# Altium footprint library Pezo_imp.PCBLIB: 98 footprints (part 6 of 7)
Each footprint in its own frame and in the unit in brackets; x right, y up, seen from the top. Pads: shape width x height; smd on the part's side, far side on the other; paste and mask are expansions set on the pad; w line width, h text height; cw(c..) or ccw(c..) is an arc to the next point about the centre after c.
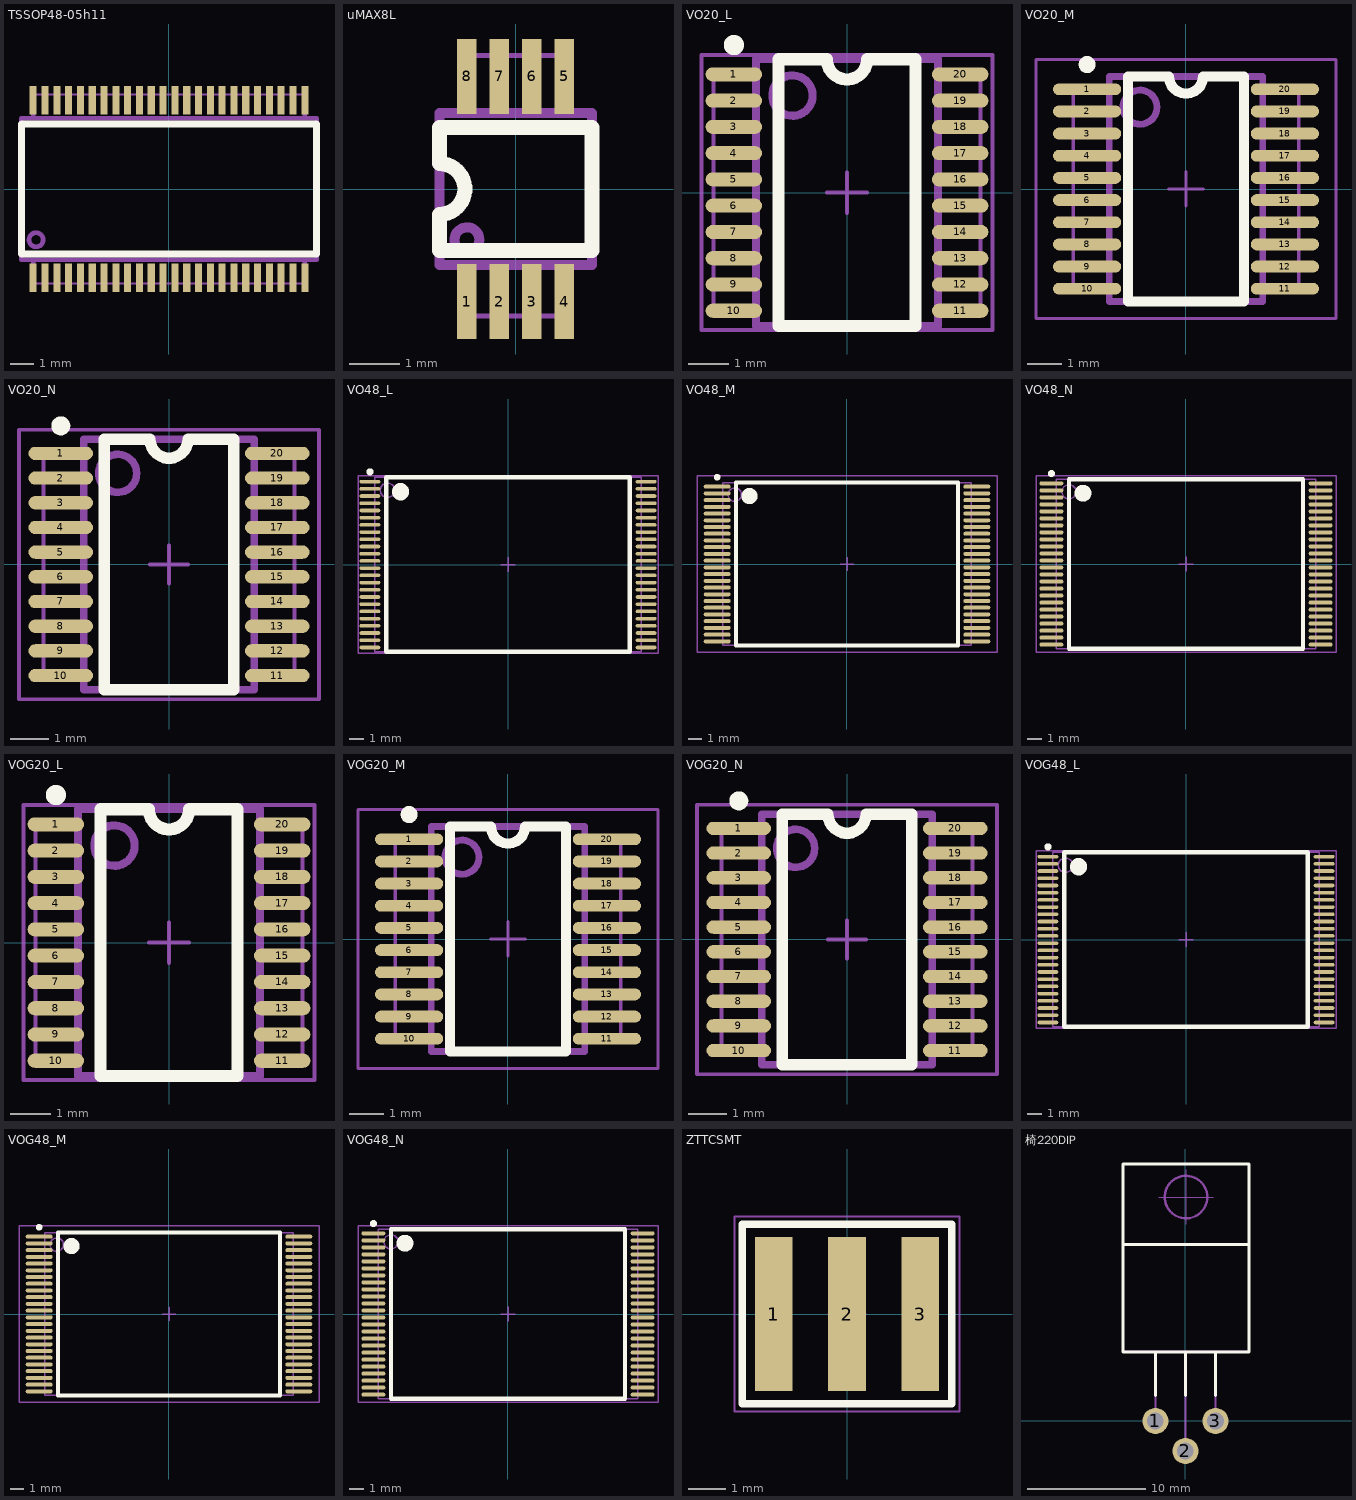
[diagram p5: the footprints below, top view; thin cyan lines are the x and y axes]

## TSSOP48-05h11 [mm]
height 1.1
pads (48):
  rect 0.3x1.2 smd: 1(-5.75,-3.75) 2(-5.25,-3.75) 3(-4.75,-3.75) 4(-4.25,-3.75) 5(-3.75,-3.75) 6(-3.25,-3.75) 7(-2.75,-3.75) 8(-2.25,-3.75) 9(-1.75,-3.75) 10(-1.25,-3.75) 11(-0.75,-3.75) 12(-0.25,-3.75) 13(0.25,-3.75) 14(0.75,-3.75) 15(1.25,-3.75) 16(1.75,-3.75) 17(2.25,-3.75) 18(2.75,-3.75) 19(3.25,-3.75) 20(3.75,-3.75) 21(4.25,-3.75) 22(4.75,-3.75) 23(5.25,-3.75) 24(5.75,-3.75) 25(5.75,3.75) 26(5.25,3.75) 27(4.75,3.75) 28(4.25,3.75) 29(3.75,3.75) 30(3.25,3.75) 31(2.75,3.75) 32(2.25,3.75) 33(1.75,3.75) 34(1.25,3.75) 35(0.75,3.75) 36(0.25,3.75) 37(-0.25,3.75) 38(-0.75,3.75) 39(-1.25,3.75) 40(-1.75,3.75) 41(-2.25,3.75) 42(-2.75,3.75) 43(-3.25,3.75) 44(-3.75,3.75) 45(-4.25,3.75) 46(-4.75,3.75) 47(-5.25,3.75) 48(-5.75,3.75)
Top Overlay:
  lines w0.3: -6.25,-2.75 6.25,-2.75 6.25,2.75 -6.25,2.75 -6.25,-2.75
Mechanical 1:
  circle w0.2: c-5.625,-2.15 r0.3
  lines w0.1: -5.75,-4 -0.4,-4 ; -5.75,4 -0.4,4 ; -0.05,-4 0.05,-4 ; -0.05,4 0.05,4 ; 0.4,-4 5.75,-4 ; 0.4,4 5.75,4
  lines w0.2: -5.75,-4 -5.75,-3 ; -5.75,3 -5.75,4 ; 5.75,-4 5.75,-3 ; 5.75,3 5.75,4 ; -6.25,-3 6.25,-3 6.25,3 -6.25,3 -6.25,-3
  text "48" at -5.623,1.457 h1.5
  text ".Designator" at -0.765,0.63 h1.5
  text ".Comment" at -2.355,-1.07 h1.5
3D body "TSSOP48-05h11.stp": height 1.21, standoff 0, extent -6.25,-4 6.25,4

## uMAX8L [mm]
height 1.1
pads (8):
  rect 0.39x1.5 smd: 1(-0.975,-2.25) 2(-0.325,-2.25) 3(0.325,-2.25) 4(0.975,-2.25) 5(0.975,2.25) 6(0.325,2.25) 7(-0.325,2.25) 8(-0.975,2.25)
Top Overlay:
  lines w0.3: -1.524,-1.23 -1.524,-0.508 ccw(c-1.524,0) -1.524,0.508 -1.524,1.23 1.524,1.23 1.524,-1.23 -1.524,-1.23
Mechanical 1:
  circle w0.2: c-0.975,-1.016 r0.25
  lines w0.1: -1.016,-2.54 -0.381,-2.54 ; -1.016,2.667 -0.381,2.667 ; -0.127,-2.54 0.127,-2.54 ; -0.127,2.667 0.127,2.667 ; 0.381,-2.54 1.016,-2.54 ; 0.381,2.667 1.016,2.667
  lines w0.2: -1.016,-2.54 -1.016,-1.524 ; -1.016,1.651 -1.016,2.667 ; 1.016,-2.54 1.016,-1.524 ; 1.016,1.651 1.016,2.667 ; -1.524,-1.524 1.524,-1.524 1.524,1.524 -1.524,1.524 -1.524,-1.524
  text ".Designator" at -1.3,0.3 h1.5
  text ".Comment" at -1.225,-1.1 h1.5

## VO20_L [mm] "TSOP, 20-Leads, Body 6.5x4.4mm, Pitch 0.65mm, IPC High Density"
height 1.2
pads (20):
  oval 1.4x0.35 smd: 1(-2.8,2.925) 2(-2.8,2.275) 3(-2.8,1.625) 4(-2.8,0.975) 5(-2.8,0.325) 6(-2.8,-0.325) 7(-2.8,-0.975) 8(-2.8,-1.625) 9(-2.8,-2.275) 10(-2.8,-2.925) 11(2.8,-2.925) 12(2.8,-2.275) 13(2.8,-1.625) 14(2.8,-0.975) 15(2.8,-0.325) 16(2.8,0.325) 17(2.8,0.975) 18(2.8,1.625) 19(2.8,2.275) 20(2.8,2.925)
Top Overlay:
  circle w0.25: c-2.8,3.65 r0.125
  lines w0.3: -1.7,-3.3 1.7,-3.3 1.7,3.3 0.5,3.3 cw(c0,3.3) -0.5,3.3 -1.7,3.3 -1.7,-3.3
Mechanical 1:
  circle w0.2: c-1.35,2.4 r0.5
  lines w0.1: -3.302,-2.921 -3.302,-0.5 ; -3.302,-0.127 -3.302,0.127 ; -3.302,0.5 -3.302,2.921 ; 3.302,-2.921 3.302,-0.5 ; 3.302,-0.127 3.302,0.127 ; 3.302,0.5 3.302,2.921
  lines w0.2: -3.302,-2.921 -2.25,-2.921 ; -3.302,2.921 -2.25,2.921 ; 2.25,-2.921 3.302,-2.921 ; 2.25,2.921 3.302,2.921 ; -2.25,-3.3 2.25,-3.3 2.25,3.3 -2.25,3.3 -2.25,-3.3
  text ".Comment" at -1.7,2.9 h1.5
  text ".Designator" at 0.85,1.61 h1.5
Mechanical 15:
  lines w0.1: -0.5,0 0.5,0 ; 0,-0.5 0,0.5 ; -3.6,-3.4 3.6,-3.4 3.6,3.4 -3.6,3.4 -3.6,-3.4
3D body: height 1.2, standoff 0, extent -2.25,-3.3 2.25,3.3

## VO20_M [mm] "TSOP, 20-Leads, Body 6.5x4.4mm, Pitch 0.65mm, IPC Low Density"
height 1.2
pads (20):
  oval 2x0.35 smd: 1(-2.9,2.925) 2(-2.9,2.275) 3(-2.9,1.625) 4(-2.9,0.975) 5(-2.9,0.325) 6(-2.9,-0.325) 7(-2.9,-0.975) 8(-2.9,-1.625) 9(-2.9,-2.275) 10(-2.9,-2.925) 11(2.9,-2.925) 12(2.9,-2.275) 13(2.9,-1.625) 14(2.9,-0.975) 15(2.9,-0.325) 16(2.9,0.325) 17(2.9,0.975) 18(2.9,1.625) 19(2.9,2.275) 20(2.9,2.925)
Top Overlay:
  circle w0.25: c-2.9,3.65 r0.125
  lines w0.3: -1.7,-3.3 -1.7,3.3 -0.5,3.3 ccw(c0,3.3) 0.5,3.3 1.7,3.3 1.7,-3.3 -1.7,-3.3
Mechanical 1:
  circle w0.2: c-1.35,2.4 r0.5
  lines w0.1: -3.302,-2.921 -3.302,-0.5 ; -3.302,-0.127 -3.302,0.127 ; -3.302,0.5 -3.302,2.921 ; 3.302,-2.921 3.302,-0.5 ; 3.302,-0.127 3.302,0.127 ; 3.302,0.5 3.302,2.921
  lines w0.2: -3.302,-2.921 -2.25,-2.921 ; -3.302,2.921 -2.25,2.921 ; 2.25,-2.921 3.302,-2.921 ; 2.25,2.921 3.302,2.921 ; -2.25,-3.3 -2.25,3.3 2.25,3.3 2.25,-3.3 -2.25,-3.3
  text ".Comment" at -1.7,2.9 h1.5
  text ".Designator" at 0.85,1.61 h1.5
Mechanical 15:
  lines w0.1: -0.5,0 0.5,0 ; 0,-0.5 0,0.5 ; -4.4,-3.8 4.4,-3.8 4.4,3.8 -4.4,3.8 -4.4,-3.8
3D body: height 1.2, standoff 0, extent -2.25,-3.3 2.25,3.3

## VO20_N [mm] "TSOP, 20-Leads, Body 6.5x4.4mm, Pitch 0.65mm, IPC Medium Density"
height 1.2
pads (20):
  oval 1.7x0.35 smd: 1(-2.85,2.925) 2(-2.85,2.275) 3(-2.85,1.625) 4(-2.85,0.975) 5(-2.85,0.325) 6(-2.85,-0.325) 7(-2.85,-0.975) 8(-2.85,-1.625) 9(-2.85,-2.275) 10(-2.85,-2.925) 11(2.85,-2.925) 12(2.85,-2.275) 13(2.85,-1.625) 14(2.85,-0.975) 15(2.85,-0.325) 16(2.85,0.325) 17(2.85,0.975) 18(2.85,1.625) 19(2.85,2.275) 20(2.85,2.925)
Top Overlay:
  circle w0.25: c-2.85,3.65 r0.125
  lines w0.3: -1.7,-3.3 -1.7,3.3 -0.5,3.3 ccw(c0,3.3) 0.5,3.3 1.7,3.3 1.7,-3.3 -1.7,-3.3
Mechanical 1:
  circle w0.2: c-1.35,2.4 r0.5
  lines w0.1: -3.302,-2.921 -3.302,-0.5 ; -3.302,-0.127 -3.302,0.127 ; -3.302,0.5 -3.302,2.921 ; 3.302,-2.921 3.302,-0.5 ; 3.302,-0.127 3.302,0.127 ; 3.302,0.5 3.302,2.921
  lines w0.2: -3.302,-2.921 -2.25,-2.921 ; -3.302,2.921 -2.25,2.921 ; 2.25,-2.921 3.302,-2.921 ; 2.25,2.921 3.302,2.921 ; -2.25,-3.3 2.25,-3.3 2.25,3.3 -2.25,3.3 -2.25,-3.3
  text ".Designator" at 0.85,1.61 h1.5
  text ".Comment" at -1.7,2.9 h1.5
Mechanical 15:
  lines w0.1: -0.5,0 0.5,0 ; 0,-0.5 0,0.5 ; -3.95,-3.55 3.95,-3.55 3.95,3.55 -3.95,3.55 -3.95,-3.55
3D body: height 1.2, standoff 0, extent -2.25,-3.3 2.25,3.3

## VO48_L [mm] "TSSOP, 48-Leads, Body 12x18.5mm, Pitch 0.5mm, IPC High Density"
height 1.2
pads (48):
  oval 1.45x0.25 smd: 1(-9.575,5.75) 2(-9.575,5.25) 3(-9.575,4.75) 4(-9.575,4.25) 5(-9.575,3.75) 6(-9.575,3.25) 7(-9.575,2.75) 8(-9.575,2.25) 9(-9.575,1.75) 10(-9.575,1.25) 11(-9.575,0.75) 12(-9.575,0.25) 13(-9.575,-0.25) 14(-9.575,-0.75) 15(-9.575,-1.25) 16(-9.575,-1.75) 17(-9.575,-2.25) 18(-9.575,-2.75) 19(-9.575,-3.25) 20(-9.575,-3.75) 21(-9.575,-4.25) 22(-9.575,-4.75) 23(-9.575,-5.25) 24(-9.575,-5.75) 25(9.575,-5.75) 26(9.575,-5.25) 27(9.575,-4.75) 28(9.575,-4.25) 29(9.575,-3.75) 30(9.575,-3.25) 31(9.575,-2.75) 32(9.575,-2.25) 33(9.575,-1.75) 34(9.575,-1.25) 35(9.575,-0.75) 36(9.575,-0.25) 37(9.575,0.25) 38(9.575,0.75) 39(9.575,1.25) 40(9.575,1.75) 41(9.575,2.25) 42(9.575,2.75) 43(9.575,3.25) 44(9.575,3.75) 45(9.575,4.25) 46(9.575,4.75) 47(9.575,5.25) 48(9.575,5.75)
Top Overlay:
  circle w0.6: c-7.45,5.05 r0.3
  circle w0.25: c-9.575,6.425 r0.125
  lines w0.3: -8.45,-6.05 8.45,-6.05 8.45,6.05 -8.45,6.05 -8.45,-6.05
Mechanical 13:
  circle w0.1: c-8.35,5.15 r0.5
  lines w0.1: -9.25,-6.05 9.25,-6.05 9.25,6.05 -9.25,6.05 -9.25,-6.05
Mechanical 15:
  lines w0.1: -0.5,0 0.5,0 ; 0,-0.5 0,0.5 ; -10.4,-6.15 10.4,-6.15 10.4,6.15 -10.4,6.15 -10.4,-6.15
3D body: height 1.2, standoff 0, extent -9.25,-6.05 9.25,6.05

## VO48_M [mm] "TSSOP, 48-Leads, Body 12x18.5mm, Pitch 0.5mm, IPC Low Density"
height 1.2
pads (48):
  oval 2x0.3 smd: 1(-9.65,5.75) 2(-9.65,5.25) 3(-9.65,4.75) 4(-9.65,4.25) 5(-9.65,3.75) 6(-9.65,3.25) 7(-9.65,2.75) 8(-9.65,2.25) 9(-9.65,1.75) 10(-9.65,1.25) 11(-9.65,0.75) 12(-9.65,0.25) 13(-9.65,-0.25) 14(-9.65,-0.75) 15(-9.65,-1.25) 16(-9.65,-1.75) 17(-9.65,-2.25) 18(-9.65,-2.75) 19(-9.65,-3.25) 20(-9.65,-3.75) 21(-9.65,-4.25) 22(-9.65,-4.75) 23(-9.65,-5.25) 24(-9.65,-5.75) 25(9.65,-5.75) 26(9.65,-5.25) 27(9.65,-4.75) 28(9.65,-4.25) 29(9.65,-3.75) 30(9.65,-3.25) 31(9.65,-2.75) 32(9.65,-2.25) 33(9.65,-1.75) 34(9.65,-1.25) 35(9.65,-0.75) 36(9.65,-0.25) 37(9.65,0.25) 38(9.65,0.75) 39(9.65,1.25) 40(9.65,1.75) 41(9.65,2.25) 42(9.65,2.75) 43(9.65,3.25) 44(9.65,3.75) 45(9.65,4.25) 46(9.65,4.75) 47(9.65,5.25) 48(9.65,5.75)
Top Overlay:
  circle w0.6: c-7.25,5.05 r0.3
  circle w0.25: c-9.65,6.45 r0.125
  lines w0.3: -8.25,-6.05 8.25,-6.05 8.25,6.05 -8.25,6.05 -8.25,-6.05
Mechanical 13:
  circle w0.1: c-8.35,5.15 r0.5
  lines w0.1: -9.25,-6.05 9.25,-6.05 9.25,6.05 -9.25,6.05 -9.25,-6.05
Mechanical 15:
  lines w0.1: -0.5,0 0.5,0 ; 0,-0.5 0,0.5 ; -11.15,-6.55 11.15,-6.55 11.15,6.55 -11.15,6.55 -11.15,-6.55
3D body: height 1.2, standoff 0, extent -9.25,-6.05 9.25,6.05

## VO48_N [mm] "TSSOP, 48-Leads, Body 12x18.5mm, Pitch 0.5mm, IPC Medium Density"
height 1.2
pads (48):
  oval 1.7x0.3 smd: 1(-9.6,5.75) 2(-9.6,5.25) 3(-9.6,4.75) 4(-9.6,4.25) 5(-9.6,3.75) 6(-9.6,3.25) 7(-9.6,2.75) 8(-9.6,2.25) 9(-9.6,1.75) 10(-9.6,1.25) 11(-9.6,0.75) 12(-9.6,0.25) 13(-9.6,-0.25) 14(-9.6,-0.75) 15(-9.6,-1.25) 16(-9.6,-1.75) 17(-9.6,-2.25) 18(-9.6,-2.75) 19(-9.6,-3.25) 20(-9.6,-3.75) 21(-9.6,-4.25) 22(-9.6,-4.75) 23(-9.6,-5.25) 24(-9.6,-5.75) 25(9.6,-5.75) 26(9.6,-5.25) 27(9.6,-4.75) 28(9.6,-4.25) 29(9.6,-3.75) 30(9.6,-3.25) 31(9.6,-2.75) 32(9.6,-2.25) 33(9.6,-1.75) 34(9.6,-1.25) 35(9.6,-0.75) 36(9.6,-0.25) 37(9.6,0.25) 38(9.6,0.75) 39(9.6,1.25) 40(9.6,1.75) 41(9.6,2.25) 42(9.6,2.75) 43(9.6,3.25) 44(9.6,3.75) 45(9.6,4.25) 46(9.6,4.75) 47(9.6,5.25) 48(9.6,5.75)
Top Overlay:
  circle w0.25: c-9.6,6.45 r0.125
  circle w0.6: c-7.35,5.05 r0.3
  lines w0.3: -8.35,-6.05 -8.35,6.05 8.35,6.05 8.35,-6.05 -8.35,-6.05
Mechanical 13:
  circle w0.1: c-8.35,5.15 r0.5
  lines w0.1: -9.25,-6.05 -9.25,6.05 9.25,6.05 9.25,-6.05 -9.25,-6.05
Mechanical 15:
  lines w0.1: -0.5,0 0.5,0 ; 0,-0.5 0,0.5 ; -10.7,-6.3 -10.7,6.3 10.7,6.3 10.7,-6.3 -10.7,-6.3
3D body: height 1.2, standoff 0, extent -9.25,-6.05 9.25,6.05

## VOG20_L [mm] "TSOP, 20-Leads, Body 6.5x4.4mm, Pitch 0.65mm, IPC High Density"
height 1.2
pads (20):
  oval 1.4x0.35 smd: 1(-2.8,2.925) 2(-2.8,2.275) 3(-2.8,1.625) 4(-2.8,0.975) 5(-2.8,0.325) 6(-2.8,-0.325) 7(-2.8,-0.975) 8(-2.8,-1.625) 9(-2.8,-2.275) 10(-2.8,-2.925) 11(2.8,-2.925) 12(2.8,-2.275) 13(2.8,-1.625) 14(2.8,-0.975) 15(2.8,-0.325) 16(2.8,0.325) 17(2.8,0.975) 18(2.8,1.625) 19(2.8,2.275) 20(2.8,2.925)
Top Overlay:
  circle w0.25: c-2.8,3.65 r0.125
  lines w0.3: -1.7,-3.3 1.7,-3.3 1.7,3.3 0.5,3.3 cw(c0,3.3) -0.5,3.3 -1.7,3.3 -1.7,-3.3
Mechanical 1:
  circle w0.2: c-1.35,2.4 r0.5
  lines w0.1: -3.302,-2.921 -3.302,-0.5 ; -3.302,-0.127 -3.302,0.127 ; -3.302,0.5 -3.302,2.921 ; 3.302,-2.921 3.302,-0.5 ; 3.302,-0.127 3.302,0.127 ; 3.302,0.5 3.302,2.921
  lines w0.2: -3.302,-2.921 -2.25,-2.921 ; -3.302,2.921 -2.25,2.921 ; 2.25,-2.921 3.302,-2.921 ; 2.25,2.921 3.302,2.921 ; -2.25,-3.3 2.25,-3.3 2.25,3.3 -2.25,3.3 -2.25,-3.3
  text ".Designator" at 0.85,1.61 h1.5
  text ".Comment" at -1.7,2.9 h1.5
Mechanical 15:
  lines w0.1: -0.5,0 0.5,0 ; 0,-0.5 0,0.5 ; -3.6,-3.4 -3.6,3.4 3.6,3.4 3.6,-3.4 -3.6,-3.4
3D body: height 1.2, standoff 0, extent -2.25,-3.3 2.25,3.3

## VOG20_M [mm] "TSOP, 20-Leads, Body 6.5x4.4mm, Pitch 0.65mm, IPC Low Density"
height 1.2
pads (20):
  oval 2x0.35 smd: 1(-2.9,2.925) 2(-2.9,2.275) 3(-2.9,1.625) 4(-2.9,0.975) 5(-2.9,0.325) 6(-2.9,-0.325) 7(-2.9,-0.975) 8(-2.9,-1.625) 9(-2.9,-2.275) 10(-2.9,-2.925) 11(2.9,-2.925) 12(2.9,-2.275) 13(2.9,-1.625) 14(2.9,-0.975) 15(2.9,-0.325) 16(2.9,0.325) 17(2.9,0.975) 18(2.9,1.625) 19(2.9,2.275) 20(2.9,2.925)
Top Overlay:
  circle w0.25: c-2.9,3.65 r0.125
  lines w0.3: -1.7,-3.3 -1.7,3.3 -0.5,3.3 ccw(c0,3.3) 0.5,3.3 1.7,3.3 1.7,-3.3 -1.7,-3.3
Mechanical 1:
  circle w0.2: c-1.35,2.4 r0.5
  lines w0.1: -3.302,-2.921 -3.302,-0.5 ; -3.302,-0.127 -3.302,0.127 ; -3.302,0.5 -3.302,2.921 ; 3.302,-2.921 3.302,-0.5 ; 3.302,-0.127 3.302,0.127 ; 3.302,0.5 3.302,2.921
  lines w0.2: -3.302,-2.921 -2.25,-2.921 ; -3.302,2.921 -2.25,2.921 ; 2.25,-2.921 3.302,-2.921 ; 2.25,2.921 3.302,2.921 ; -2.25,-3.3 -2.25,3.3 2.25,3.3 2.25,-3.3 -2.25,-3.3
  text ".Designator" at 0.85,1.61 h1.5
  text ".Comment" at -1.7,2.9 h1.5
Mechanical 15:
  lines w0.1: -0.5,0 0.5,0 ; 0,-0.5 0,0.5 ; -4.4,-3.8 4.4,-3.8 4.4,3.8 -4.4,3.8 -4.4,-3.8
3D body: height 1.2, standoff 0, extent -2.25,-3.3 2.25,3.3

## VOG20_N [mm] "TSOP, 20-Leads, Body 6.5x4.4mm, Pitch 0.65mm, IPC Medium Density"
height 1.2
pads (20):
  oval 1.7x0.35 smd: 1(-2.85,2.925) 2(-2.85,2.275) 3(-2.85,1.625) 4(-2.85,0.975) 5(-2.85,0.325) 6(-2.85,-0.325) 7(-2.85,-0.975) 8(-2.85,-1.625) 9(-2.85,-2.275) 10(-2.85,-2.925) 11(2.85,-2.925) 12(2.85,-2.275) 13(2.85,-1.625) 14(2.85,-0.975) 15(2.85,-0.325) 16(2.85,0.325) 17(2.85,0.975) 18(2.85,1.625) 19(2.85,2.275) 20(2.85,2.925)
Top Overlay:
  circle w0.25: c-2.85,3.65 r0.125
  lines w0.3: -1.7,-3.3 1.7,-3.3 1.7,3.3 0.5,3.3 cw(c0,3.3) -0.5,3.3 -1.7,3.3 -1.7,-3.3
Mechanical 1:
  circle w0.2: c-1.35,2.4 r0.5
  lines w0.1: -3.302,-2.921 -3.302,-0.5 ; -3.302,-0.127 -3.302,0.127 ; -3.302,0.5 -3.302,2.921 ; 3.302,-2.921 3.302,-0.5 ; 3.302,-0.127 3.302,0.127 ; 3.302,0.5 3.302,2.921
  lines w0.2: -3.302,-2.921 -2.25,-2.921 ; -3.302,2.921 -2.25,2.921 ; 2.25,-2.921 3.302,-2.921 ; 2.25,2.921 3.302,2.921 ; -2.25,-3.3 2.25,-3.3 2.25,3.3 -2.25,3.3 -2.25,-3.3
  text ".Comment" at -1.7,2.9 h1.5
  text ".Designator" at 0.85,1.61 h1.5
Mechanical 15:
  lines w0.1: -0.5,0 0.5,0 ; 0,-0.5 0,0.5 ; -3.95,-3.55 3.95,-3.55 3.95,3.55 -3.95,3.55 -3.95,-3.55
3D body: height 1.2, standoff 0, extent -2.25,-3.3 2.25,3.3

## VOG48_L [mm] "TSSOP, 48-Leads, Body 12x18.5mm, Pitch 0.5mm, IPC High Density"
height 1.2
pads (48):
  oval 1.45x0.25 smd: 1(-9.575,5.75) 2(-9.575,5.25) 3(-9.575,4.75) 4(-9.575,4.25) 5(-9.575,3.75) 6(-9.575,3.25) 7(-9.575,2.75) 8(-9.575,2.25) 9(-9.575,1.75) 10(-9.575,1.25) 11(-9.575,0.75) 12(-9.575,0.25) 13(-9.575,-0.25) 14(-9.575,-0.75) 15(-9.575,-1.25) 16(-9.575,-1.75) 17(-9.575,-2.25) 18(-9.575,-2.75) 19(-9.575,-3.25) 20(-9.575,-3.75) 21(-9.575,-4.25) 22(-9.575,-4.75) 23(-9.575,-5.25) 24(-9.575,-5.75) 25(9.575,-5.75) 26(9.575,-5.25) 27(9.575,-4.75) 28(9.575,-4.25) 29(9.575,-3.75) 30(9.575,-3.25) 31(9.575,-2.75) 32(9.575,-2.25) 33(9.575,-1.75) 34(9.575,-1.25) 35(9.575,-0.75) 36(9.575,-0.25) 37(9.575,0.25) 38(9.575,0.75) 39(9.575,1.25) 40(9.575,1.75) 41(9.575,2.25) 42(9.575,2.75) 43(9.575,3.25) 44(9.575,3.75) 45(9.575,4.25) 46(9.575,4.75) 47(9.575,5.25) 48(9.575,5.75)
Top Overlay:
  circle w0.25: c-9.575,6.425 r0.125
  circle w0.6: c-7.45,5.05 r0.3
  lines w0.3: -8.45,-6.05 -8.45,6.05 8.45,6.05 8.45,-6.05 -8.45,-6.05
Mechanical 13:
  circle w0.1: c-8.35,5.15 r0.5
  lines w0.1: -9.25,-6.05 -9.25,6.05 9.25,6.05 9.25,-6.05 -9.25,-6.05
Mechanical 15:
  lines w0.1: -0.5,0 0.5,0 ; 0,-0.5 0,0.5 ; -10.4,-6.15 -10.4,6.15 10.4,6.15 10.4,-6.15 -10.4,-6.15
3D body: height 1.2, standoff 0, extent -9.25,-6.05 9.25,6.05

## VOG48_M [mm] "TSSOP, 48-Leads, Body 12x18.5mm, Pitch 0.5mm, IPC Low Density"
height 1.2
pads (48):
  oval 2x0.3 smd: 1(-9.65,5.75) 2(-9.65,5.25) 3(-9.65,4.75) 4(-9.65,4.25) 5(-9.65,3.75) 6(-9.65,3.25) 7(-9.65,2.75) 8(-9.65,2.25) 9(-9.65,1.75) 10(-9.65,1.25) 11(-9.65,0.75) 12(-9.65,0.25) 13(-9.65,-0.25) 14(-9.65,-0.75) 15(-9.65,-1.25) 16(-9.65,-1.75) 17(-9.65,-2.25) 18(-9.65,-2.75) 19(-9.65,-3.25) 20(-9.65,-3.75) 21(-9.65,-4.25) 22(-9.65,-4.75) 23(-9.65,-5.25) 24(-9.65,-5.75) 25(9.65,-5.75) 26(9.65,-5.25) 27(9.65,-4.75) 28(9.65,-4.25) 29(9.65,-3.75) 30(9.65,-3.25) 31(9.65,-2.75) 32(9.65,-2.25) 33(9.65,-1.75) 34(9.65,-1.25) 35(9.65,-0.75) 36(9.65,-0.25) 37(9.65,0.25) 38(9.65,0.75) 39(9.65,1.25) 40(9.65,1.75) 41(9.65,2.25) 42(9.65,2.75) 43(9.65,3.25) 44(9.65,3.75) 45(9.65,4.25) 46(9.65,4.75) 47(9.65,5.25) 48(9.65,5.75)
Top Overlay:
  circle w0.25: c-9.65,6.45 r0.125
  circle w0.6: c-7.25,5.05 r0.3
  lines w0.3: -8.25,-6.05 -8.25,6.05 8.25,6.05 8.25,-6.05 -8.25,-6.05
Mechanical 13:
  circle w0.1: c-8.35,5.15 r0.5
  lines w0.1: -9.25,-6.05 -9.25,6.05 9.25,6.05 9.25,-6.05 -9.25,-6.05
Mechanical 15:
  lines w0.1: -0.5,0 0.5,0 ; 0,-0.5 0,0.5 ; -11.15,-6.55 -11.15,6.55 11.15,6.55 11.15,-6.55 -11.15,-6.55
3D body: height 1.2, standoff 0, extent -9.25,-6.05 9.25,6.05

## VOG48_N [mm] "TSSOP, 48-Leads, Body 12x18.5mm, Pitch 0.5mm, IPC Medium Density"
height 1.2
pads (48):
  oval 1.7x0.3 smd: 1(-9.6,5.75) 2(-9.6,5.25) 3(-9.6,4.75) 4(-9.6,4.25) 5(-9.6,3.75) 6(-9.6,3.25) 7(-9.6,2.75) 8(-9.6,2.25) 9(-9.6,1.75) 10(-9.6,1.25) 11(-9.6,0.75) 12(-9.6,0.25) 13(-9.6,-0.25) 14(-9.6,-0.75) 15(-9.6,-1.25) 16(-9.6,-1.75) 17(-9.6,-2.25) 18(-9.6,-2.75) 19(-9.6,-3.25) 20(-9.6,-3.75) 21(-9.6,-4.25) 22(-9.6,-4.75) 23(-9.6,-5.25) 24(-9.6,-5.75) 25(9.6,-5.75) 26(9.6,-5.25) 27(9.6,-4.75) 28(9.6,-4.25) 29(9.6,-3.75) 30(9.6,-3.25) 31(9.6,-2.75) 32(9.6,-2.25) 33(9.6,-1.75) 34(9.6,-1.25) 35(9.6,-0.75) 36(9.6,-0.25) 37(9.6,0.25) 38(9.6,0.75) 39(9.6,1.25) 40(9.6,1.75) 41(9.6,2.25) 42(9.6,2.75) 43(9.6,3.25) 44(9.6,3.75) 45(9.6,4.25) 46(9.6,4.75) 47(9.6,5.25) 48(9.6,5.75)
Top Overlay:
  circle w0.6: c-7.35,5.05 r0.3
  circle w0.25: c-9.6,6.45 r0.125
  lines w0.3: -8.35,-6.05 8.35,-6.05 8.35,6.05 -8.35,6.05 -8.35,-6.05
Mechanical 13:
  circle w0.1: c-8.35,5.15 r0.5
  lines w0.1: -9.25,-6.05 9.25,-6.05 9.25,6.05 -9.25,6.05 -9.25,-6.05
Mechanical 15:
  lines w0.1: -0.5,0 0.5,0 ; 0,-0.5 0,0.5 ; -10.7,-6.3 10.7,-6.3 10.7,6.3 -10.7,6.3 -10.7,-6.3
3D body: height 1.2, standoff 0, extent -9.25,-6.05 9.25,6.05

## ZTTCSMT [mm] "ZTTCSMT"
height 1.6
pads (3):
  rect 1x4.1 smd mask+0.1: 1(-1.95,0) 2(0,0) 3(1.95,0)
Top Overlay:
  lines w0.2: -2.8,-2.4 2.8,-2.4 2.8,2.4 -2.8,2.4 -2.8,-2.4
Mechanical 15:
  lines w0.05: -0.5,0 0.5,0 ; 0,-0.5 0,0.5 ; -3,-2.6 3,-2.6 3,2.6 -3,2.6 -3,-2.6
3D body: height 1.6, standoff 0, extent -2.4,-2 2.4,2

## 椅220DIP [mm]
height 4.8
pads (3):
  round 2.2 hole 1.4: 1(-2.54,0) 2(0,-2.54) 3(2.54,0)
Top Overlay:
  lines w0.25: -5.28,14.942 5.37,14.942 ; -2.54,2.159 -2.54,5.842 ; 0,2.159 0,5.842 ; 2.54,2.159 2.54,5.842 ; -5.28,5.842 -5.28,21.742 5.37,21.742 5.37,5.842 -5.28,5.842
Mechanical 1:
  circle w0.2: c0.045,18.942 r1.8
  lines w0.1: -2.255,18.942 2.345,18.942 ; 0.045,16.642 0.045,21.242
  lines w0.2: -5.28,14.942 5.37,14.942 ; -2.54,0 -2.54,5.842 ; 0,-2.54 0,5.842 ; 2.54,0 2.54,5.842 ; -5.28,5.842 -5.28,21.742 5.37,21.742 5.37,5.842 -5.28,5.842
  text "2" at -0.415,6.59 h1.5
  text "3" at 2.892,6.59 h1.5
  text "1" at -3.59,6.59 h1.5
  text ".Designator" at -1.635,11.672 h1.5
3D body "椅220DIP.STEP": height 4.8, standoff -3, extent -5.325,-2.98 5.325,21.742